# Altium footprint library ATROTECH.PcbLib: 334 footprints (part 11 of 21)
Each footprint in its own frame and in the unit in brackets; x right, y up, seen from the top. Pads: shape width x height; smd on the part's side, far side on the other; paste and mask are expansions set on the pad; w line width, h text height; cw(c..) or ccw(c..) is an arc to the next point about the centre after c.
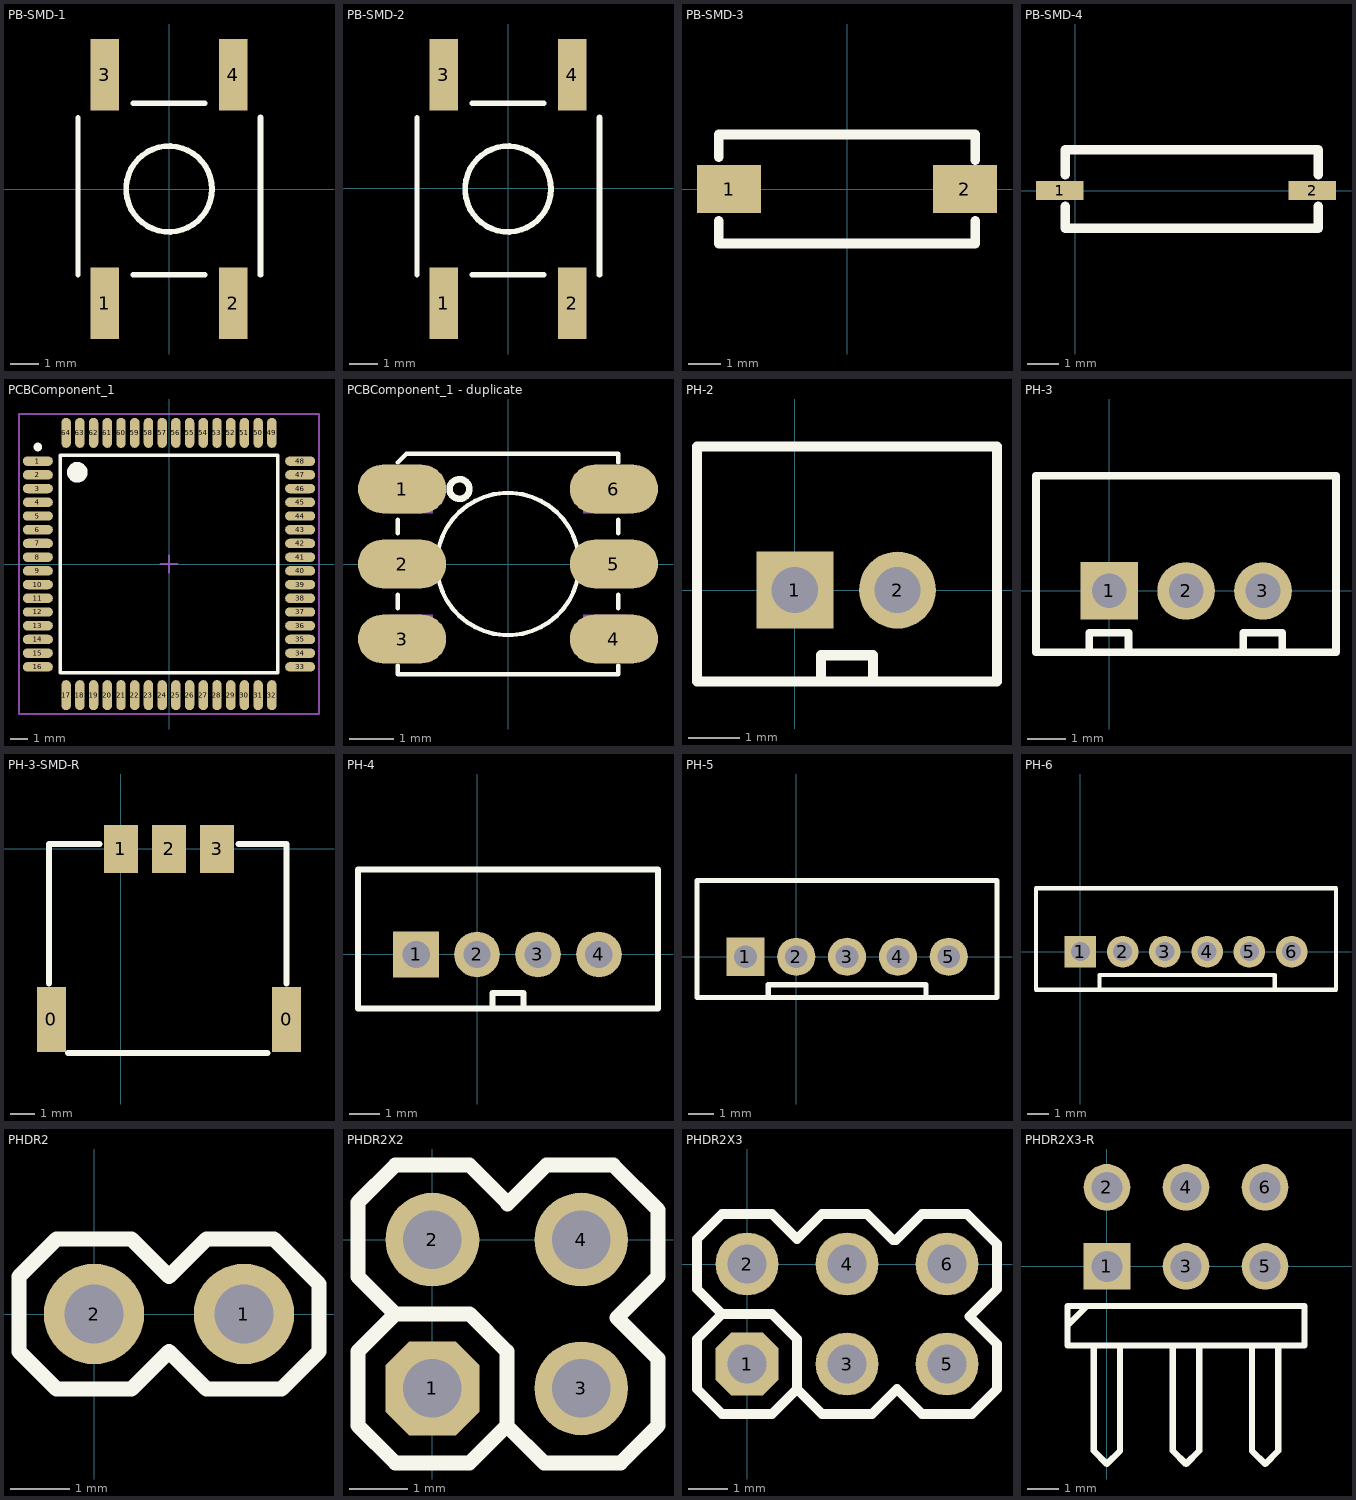
[diagram p10: the footprints below, top view; thin cyan lines are the x and y axes]

## PB-SMD-1 [mm]
pads (4):
  rect 1x2.5 smd: 1(-2.25,-3.992) 2(2.25,-3.992) 3(-2.25,3.992) 4(2.25,3.992)
Top Overlay:
  circle w0.2: c0,0 r1.5
  lines w0.178: -3.175,-2.997 -3.175,2.503
  lines w0.2: -1.25,-3 1.25,-3 ; -1.25,3 1.25,3 ; 3.2,-2.997 3.2,2.503
3D body "SW3dPS-switch.STEP": height 5, standoff 0, extent -3,-4.5 3,4.5

## PB-SMD-2 [mm]
pads (4):
  rect 1x2.5 smd: 1(-2.25,-4.018) 2(2.25,-4.018) 3(-2.25,3.967) 4(2.25,3.967)
Top Overlay:
  circle w0.2: c0,-0.025 r1.5
  lines w0.178: -3.175,-3.023 -3.175,2.477
  lines w0.2: -1.25,-3.025 1.25,-3.025 ; -1.25,2.975 1.25,2.975 ; 3.2,-3.023 3.2,2.477
3D body "1.STEP": height 4.23, standoff 0, extent -3.54,-4.555 3.54,4.445

## PB-SMD-3 [mm]
pads (2):
  rect 2x1.5 smd: 1(-3.683,0) 2(3.683,0)
Top Overlay:
  lines w0.3: -4,-1 -4,-1.7 4,-1.7 4,-1 ; -4,1 -4,1.7 4,1.7 4,0.9
3D body "Pulsador.stp": height 4.3, standoff 0, extent -4,-1.75 4,1.75

## PB-SMD-4 [mm]
pads (2):
  rect 1.5x0.6 smd: 1(-0.5,0) 2(7.5,0)
Top Overlay:
  lines w0.3: -0.317,-0.5 -0.317,-1.2 7.683,-1.2 7.683,-0.5 ; -0.317,0.5 -0.317,1.3 7.683,1.3 7.683,0.5

## PCBComponent_1 [mm]
pads (64):
  oval 1.75x0.55 smd: 1(-7.65,6) 2(-7.65,5.2) 3(-7.65,4.4) 4(-7.65,3.6) 5(-7.65,2.8) 6(-7.65,2) 7(-7.65,1.2) 8(-7.65,0.4) 9(-7.65,-0.4) 10(-7.65,-1.2) 11(-7.65,-2) 12(-7.65,-2.8) 13(-7.65,-3.6) 14(-7.65,-4.4) 15(-7.65,-5.2) 16(-7.65,-6) 33(7.65,-6) 34(7.65,-5.2) 35(7.65,-4.4) 36(7.65,-3.6) 37(7.65,-2.8) 38(7.65,-2) 39(7.65,-1.2) 40(7.65,-0.4) 41(7.65,0.4) 42(7.65,1.2) 43(7.65,2) 44(7.65,2.8) 45(7.65,3.6) 46(7.65,4.4) 47(7.65,5.2) 48(7.65,6)
  oval 0.55x1.75 smd: 17(-6,-7.65) 18(-5.2,-7.65) 19(-4.4,-7.65) 20(-3.6,-7.65) 21(-2.8,-7.65) 22(-2,-7.65) 23(-1.2,-7.65) 24(-0.4,-7.65) 25(0.4,-7.65) 26(1.2,-7.65) 27(2,-7.65) 28(2.8,-7.65) 29(3.6,-7.65) 30(4.4,-7.65) 31(5.2,-7.65) 32(6,-7.65) 49(6,7.65) 50(5.2,7.65) 51(4.4,7.65) 52(3.6,7.65) 53(2.8,7.65) 54(2,7.65) 55(1.2,7.65) 56(0.4,7.65) 57(-0.4,7.65) 58(-1.2,7.65) 59(-2,7.65) 60(-2.8,7.65) 61(-3.6,7.65) 62(-4.4,7.65) 63(-5.2,7.65) 64(-6,7.65)
Top Overlay:
  circle w0.6: c-5.35,5.35 r0.3
  circle w0.25: c-7.65,6.825 r0.125
  lines w0.2: -6.35,-6.35 6.35,-6.35 6.35,6.35 -6.35,6.35 -6.35,-6.35
Mechanical 15:
  lines w0.1: -0.5,0 0.5,0 ; 0,-0.5 0,0.5 ; -8.75,-8.75 8.75,-8.75 8.75,8.75 -8.75,8.75 -8.75,-8.75
3D body "User Library-atmega64 (tqfp64).step": height 1.1, standoff -0.01, extent -8,-8 8,8

## PCBComponent_1 - duplicate [mm]
pads (6):
  rrect100% 2x1.1 smd: 1(-2.4,1.7) 2(-2.4,0) 3(-2.4,-1.7) 4(2.4,-1.7) 5(2.4,0) 6(2.4,1.7)
Top Overlay:
  circle w0.15: c-1.1,1.7 r0.224
  circle w0.1: c0,0 r1.612
  lines w0.1: -2.5,-2.3 -2.5,-2.5 2.5,-2.5 2.5,-2.3 ; -2.5,-1 -2.5,-0.7 ; -2.5,0.7 -2.5,1 ; -2.5,2.3 -2.3,2.5 -2,2.5 2.5,2.5 2.5,2.3 ; 2.5,-1 2.5,-0.7 ; 2.5,0.7 2.5,1
Mechanical 16:
  region: -1.7,-1.15 -2.7,-1.15 -2.7,-2.05 -1.7,-2.05
  region: -1.7,0.45 -2.7,0.45 -2.7,-0.45 -1.7,-0.45
  region: -1.7,2.05 -2.7,2.05 -2.7,1.15 -1.7,1.15
  rectangle: 1.7,-2.05 2.7,-1.15
  rectangle: 1.7,1.15 2.7,2.05
  rectangle: 1.7,-0.45 2.7,0.45
3D body "User Library-APA102C.step": height 1.4, standoff -0.15, extent -2.75,-2.5 2.75,2.5

## PH-2 [mm]
pads (2):
  rect 1.5x1.5 hole 0.9: 1(0,0)
  round 1.5 hole 0.9: 2(2,0)
Top Overlay:
  lines w0.2: 0.508,-1.778 0.508,-1.27 1.524,-1.27 1.524,-1.778 ; -1.905,-1.778 3.937,-1.778 3.937,2.794 -1.905,2.794 -1.905,-1.778
3D body "User Library-b2b-ph-ks-1.step": height 6, standoff -3, extent -1.963,-1.742 3.937,2.758

## PH-3 [mm]
pads (3):
  rect 1.5x1.5 hole 0.9: 1(0,0)
  round 1.5 hole 0.9: 2(2,0) 3(4,0)
Top Overlay:
  lines w0.2: -0.516,-1.6 -0.516,-1.092 0.5,-1.092 0.5,-1.6 ; 3.484,-1.6 3.484,-1.092 4.5,-1.092 4.5,-1.6 ; -1.905,-1.6 -1.905,3 5.9,3 5.9,-1.6 -1.905,-1.6
3D body "User Library-PH2.0-3P.STEP": height 6, standoff -3.44, extent -2,-1.7 6,3.1

## PH-3-SMD-R [mm]
pads (5):
  rect 1.2x2.7 smd: 0(-2.9,-7.1) 0(6.9,-7.1)
  rect 1.4x2 smd: 1(0,0) 2(2,0) 3(4,0)
Top Overlay:
  lines w0.254: -3,-5.6 -3,0.2 -0.9,0.2 ; -2.2,-8.5 6.1,-8.5 ; 4.9,0.2 6.9,0.2 6.9,-5.6
3D body "S3B-PH-SM4-TB.stp": height 4.8, standoff 0, extent -2.95,-8.5 6.95,0.1

## PH-4 [mm]
pads (4):
  rect 1.5x1.5 hole 0.9: 1(-2,0)
  round 1.5 hole 0.9: 2(0,0) 3(2,0) 4(4,0)
Top Overlay:
  lines w0.2: 0.508,-1.778 0.508,-1.27 1.524,-1.27 1.524,-1.778 ; -3.905,-1.778 -3.905,2.794 5.937,2.794 5.937,-1.778 -3.905,-1.778
3D body "User Library-b4b-ph-k-s.step": height 6, standoff -3, extent -3.95,-1.75 5.95,2.75

## PH-5 [mm]
pads (5):
  rect 1.5x1.5 hole 0.9: 1(-2,0)
  round 1.5 hole 0.9: 2(0,0) 3(2,0) 4(4,0) 5(6,0)
Top Overlay:
  lines w0.2: -1.1,-1.6 -1.1,-1.1 5.1,-1.1 5.1,-1.6 ; -3.905,-1.6 7.9,-1.6 7.9,3 -3.905,3 -3.905,-1.6
3D body "User Library-PH2_0-5P.X_B": height 6, standoff -3.44, extent -4,-1.7 8,3.1

## PH-6 [mm]
pads (6):
  rect 1.5x1.5 hole 0.9: 1(0,0)
  round 1.5 hole 0.9: 2(2,0) 3(4,0) 4(6,0) 5(8,0) 6(10,0)
Top Overlay:
  lines w0.2: 0.9,-1.8 0.9,-1.1 9.2,-1.1 9.2,-1.8 ; -2.1,-1.8 12.1,-1.8 12.1,3 -2.1,3 -2.1,-1.8
3D body "User Library-b6b-ph-ks.step": height 6, standoff -3, extent -1.95,-1.65 11.95,2.85

## PHDR2 [mm] "Pin Header 2 M"
pads (2):
  round 1.7 hole 1: 1(2.54,0) 2(0,0)
Top Overlay:
  lines w0.254: -1.27,-0.635 -1.27,0.635 -0.635,1.27 0,1.27 0.635,1.27 1.27,0.635 1.905,1.27 3.048,1.27 3.81,0.508 3.81,-0.635 3.175,-1.27 1.905,-1.27 1.27,-0.635 0.635,-1.27 -0.635,-1.27 -1.27,-0.635
3D body "jumper.STEP": height 8.39, standoff -2.53, extent -1.244,-1.295 3.836,1.245

## PHDR2X2 [mm]
pads (4):
  oct 1.6x1.6 hole 1: 1(0,-2.54)
  round 1.6 hole 1: 2(0,0) 3(2.54,-2.54) 4(2.54,0)
Top Overlay:
  lines w0.254: 1.27,0.635 0.635,1.27 0,1.27 -0.635,1.27 -1.27,0.635 -1.27,-0.635 -0.635,-1.27 ; 1.285,0.61 1.945,1.27 3.088,1.27 3.85,0.508 3.85,-0.635 3.151,-1.333 3.85,-2.032 3.85,-3.175 3.215,-3.81 1.945,-3.81 ; 1.905,-3.81 1.27,-3.175 ; -0.635,-1.27 0.635,-1.27 1.27,-1.905 1.27,-3.175 ; -0.635,-1.27 -1.27,-1.905 -1.27,-3.175 -0.635,-3.81 0.635,-3.81 1.27,-3.175
3D body "jumper.STEP": height 8.39, standoff -2.53, extent 1.27,-3.81 3.81,1.27
3D body "jumper.STEP": height 8.39, standoff -2.53, extent -1.27,-3.81 1.27,1.27

## PHDR2X3 [mm]
pads (6):
  oct 1.6x1.6 hole 1: 1(0,-2.54)
  round 1.6 hole 1: 2(0,0) 3(2.54,-2.54) 4(2.54,0) 5(5.08,-2.54) 6(5.08,0)
Top Overlay:
  lines w0.254: -0.635,-1.27 -1.27,-0.635 -1.27,0.635 -0.635,1.27 0,1.27 0.635,1.27 1.27,0.635 1.905,1.27 3.048,1.27 3.708,0.61 3.785,0.61 4.445,1.27 5.588,1.27 6.35,0.508 6.35,-0.635 5.651,-1.333 6.35,-2.032 6.35,-3.175 5.715,-3.81 4.445,-3.81 3.81,-3.175 3.175,-3.81 1.905,-3.81 1.27,-3.175 ; -0.635,-1.27 -1.27,-1.905 -1.27,-3.175 -0.635,-3.81 0.635,-3.81 1.27,-3.175 ; -0.635,-1.27 0.635,-1.27 1.27,-1.905 1.27,-3.175
3D body "jumper.STEP": height 8.39, standoff -2.53, extent -1.27,-3.81 1.27,1.27
3D body "jumper.STEP": height 8.39, standoff -2.53, extent 1.27,-3.81 3.81,1.27
3D body "jumper.STEP": height 8.39, standoff -2.53, extent 3.81,-3.81 6.35,1.27

## PHDR2X3-R [mm]
pads (6):
  rect 1.5x1.5 hole 1: 1(0,0)
  round 1.5 hole 1: 2(0,2.54) 3(2.54,0) 4(2.54,2.54) 5(5.08,0) 6(5.08,2.54)
Top Overlay:
  lines w0.2: -1.27,-1.905 -0.635,-1.27 ; -0.423,-2.54 -0.423,-5.927 0,-6.35 0.423,-5.927 0.423,-2.54 ; 2.117,-2.54 2.117,-5.927 2.54,-6.35 2.963,-5.927 2.963,-2.54 ; 4.657,-2.54 4.657,-5.927 5.08,-6.35 5.503,-5.927 5.503,-2.54 ; -1.27,-2.54 -1.27,-1.27 6.35,-1.27 6.35,-2.54 -1.27,-2.54
3D body "12544.stp": height 5.55, standoff -3.2, extent -1.27,-9.61 6.35,2.845